# Altium integrated library Boards.IntLib: 6 symbols
Pins are listed as number, name and electrical type; pins without a type are passive.

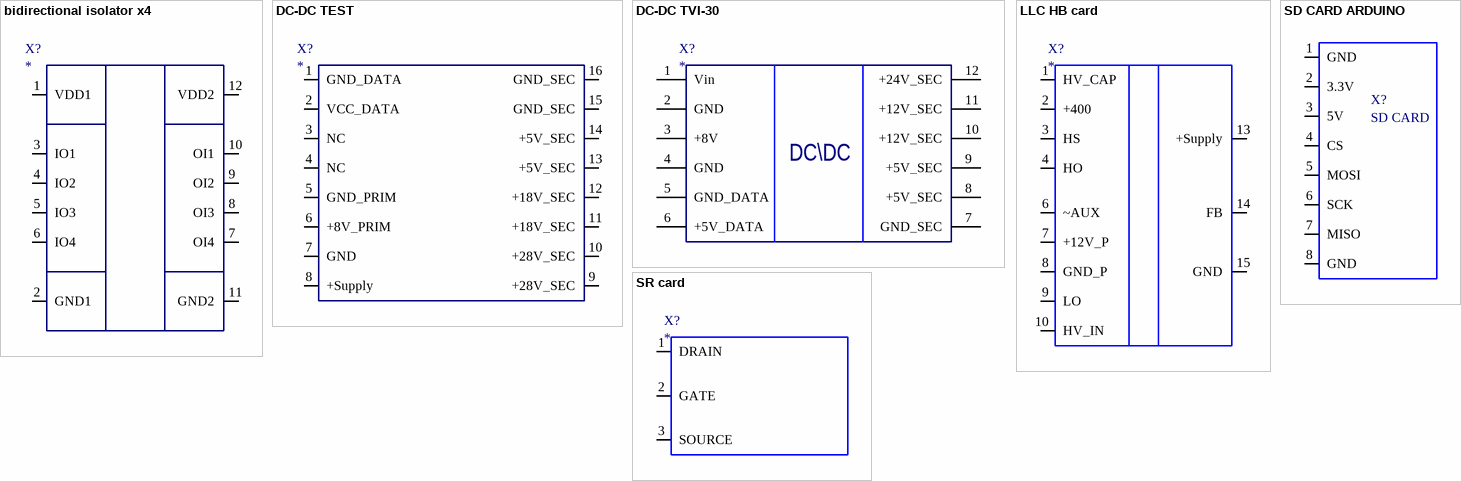
[diagram p0: symbols bidirectional isolator x4 to SR card]

## bidirectional isolator x4
designator X?
ComponentDescription: *
footprint Bidirectional isolator 4
pins: 1 VDD1, 2 GND1, 3 IO1, 4 IO2, 5 IO3, 6 IO4, 7 OI4, 8 OI3, 9 OI2, 10 OI1, 11 GND2, 12 VDD2

## DC-DC TEST
designator X?
ComponentDescription: *
footprint DC DC
pins: 1 GND_DATA, 2 VCC_DATA, 3 NC, 4 NC, 5 GND_PRIM, 6 +8V_PRIM, 7 GND, 8 +Supply, 9 +28V_SEC, 10 +28V_SEC, 11 +18V_SEC, 12 +18V_SEC, 13 +5V_SEC, 14 +5V_SEC, 15 GND_SEC, 16 GND_SEC

## DC-DC TVI-30
designator X?
ComponentDescription: *
footprint DC-DC TVI-30
pins: 1 Vin, 2 GND, 3 +8V, 4 GND, 5 GND_DATA, 6 +5V_DATA, 7 GND_SEC, 8 +5V_SEC, 9 +5V_SEC, 10 +12V_SEC, 11 +12V_SEC, 12 +24V_SEC
text: DC\DC

## LLC HB card
designator X?
footprint LLC HB card
pins: 1 HV_CAP, 2 +400, 3 HS, 4 HO, 6 ~AUX, 7 +12V_P, 8 GND_P, 9 LO, 10 HV_IN, 13 +Supply, 14 FB, 15 GND

## SD CARD ARDUINO
designator X?, comment SD CARD
footprint SD CARD ARDUINO
pins: 1 GND, 2 3.3V, 3 5V, 4 CS, 5 MOSI, 6 SCK, 7 MISO, 8 GND

## SR card
designator X?
footprint SR RECT CARD
pins: 1 DRAIN, 2 GATE, 3 SOURCE